# Altium footprint library PcbLib1.PcbLib: 56 footprints (part 1 of 4)
Each footprint in its own frame and in the unit in brackets; x right, y up, seen from the top. Pads: shape width x height; smd on the part's side, far side on the other; paste and mask are expansions set on the pad; w line width, h text height; cw(c..) or ccw(c..) is an arc to the next point about the centre after c.
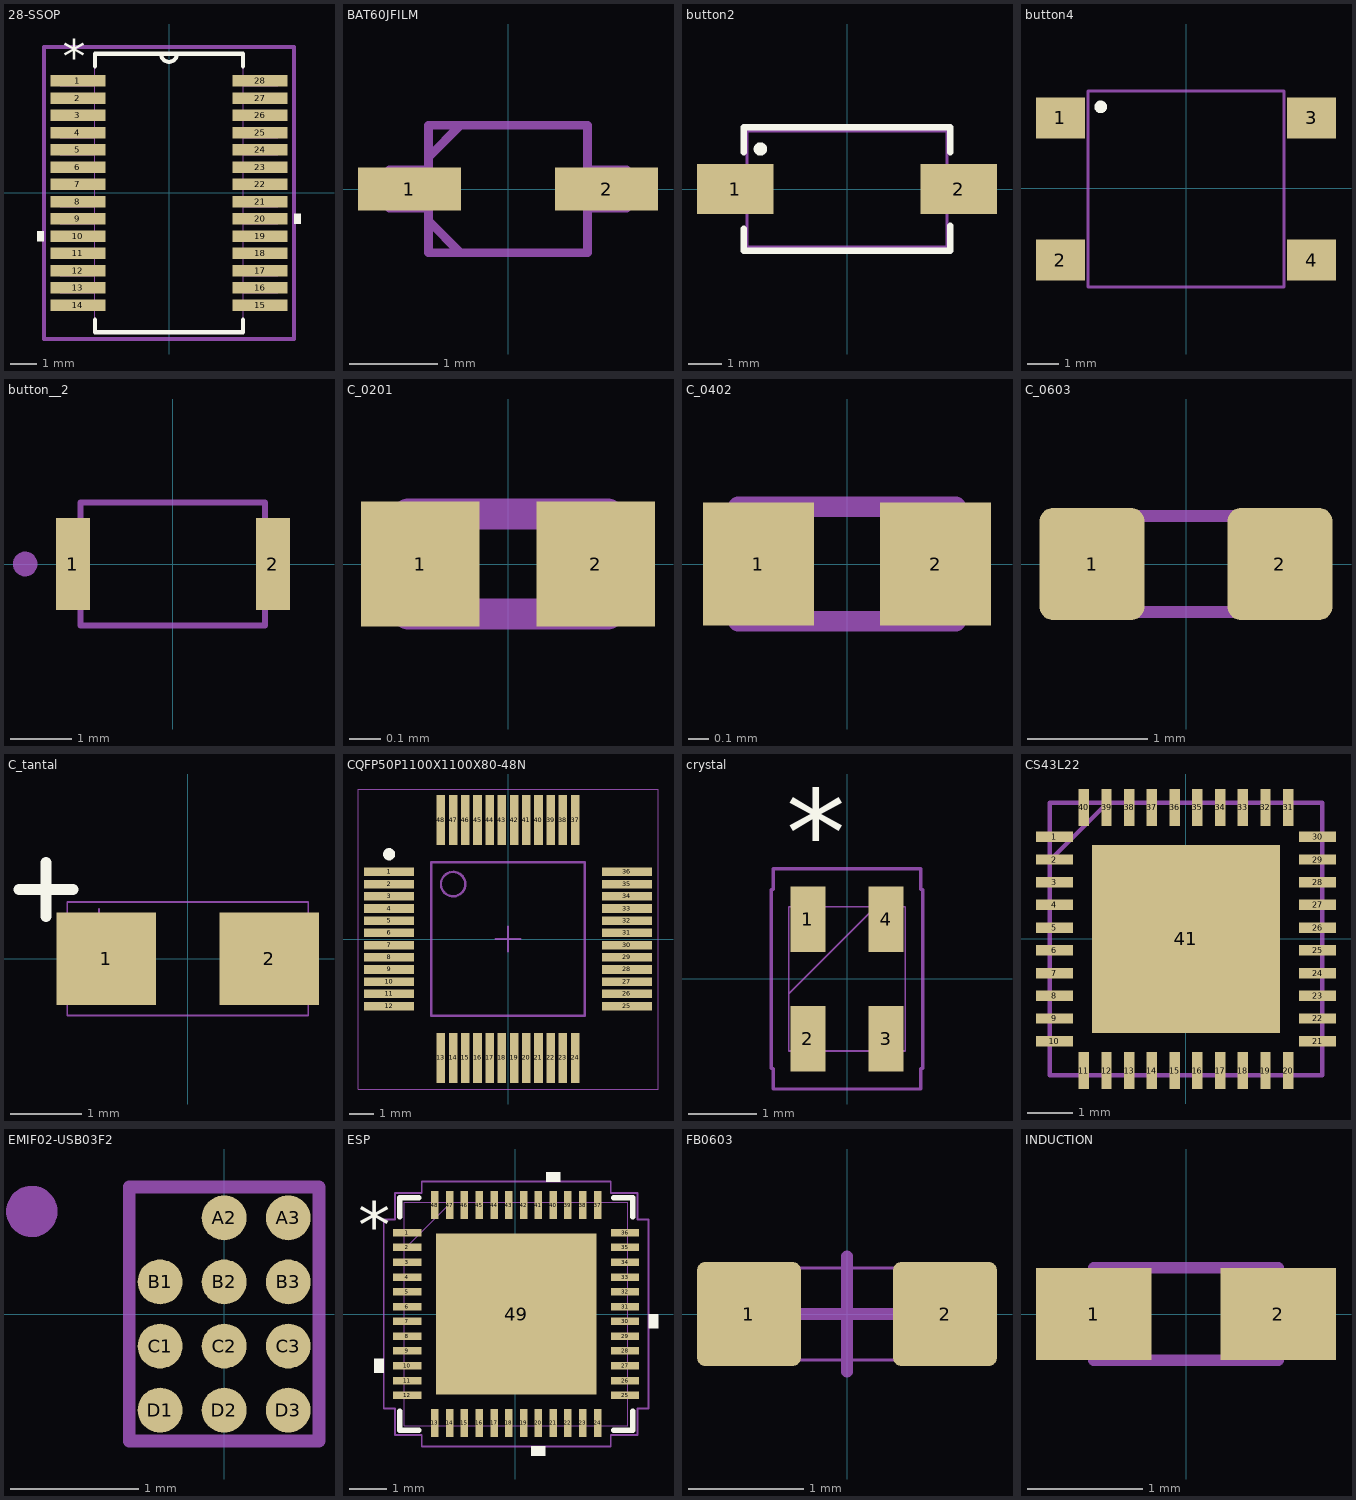
[diagram p0: the footprints below, top view; thin cyan lines are the x and y axes]

## 28-SSOP [mil]
pads (28):
  rect 81x17 smd paste-40.5 mask-40.5: 1(-135,166.34) 2(-135,140.75) 3(-135,115.16) 4(-135,89.57) 5(-135,63.98) 6(-135,38.39) 7(-135,12.8) 8(-135,-12.8) 9(-135,-38.39) 10(-135,-63.98) 11(-135,-89.57) 12(-135,-115.16) 13(-135,-140.75) 14(-135,-166.34) 15(135,-166.34) 16(135,-140.75) 17(135,-115.16) 18(135,-89.57) 19(135,-63.98) 20(135,-38.39) 21(135,-12.8) 22(135,12.8) 23(135,38.39) 24(135,63.98) 25(135,89.57) 26(135,115.16) 27(135,140.75) 28(135,166.34)
Top Overlay:
  region: 185.5,-30.89 195.5,-30.89 195.5,-45.89 185.5,-45.89
  region: -185.5,-56.48 -195.5,-56.48 -195.5,-71.48 -185.5,-71.48
  lines w6: -110,-187.94 -110,-206.5 110,-206.5 110,-187.94 ; -110,187.94 -110,206.5 110,206.5 110,187.94 ; -12,206.5 ccw(c0,206.5) 12,206.5
  text "*" at -157.5,178.34 h50
Top Assembly:
  lines w6: -185.5,-216.5 -185.5,216.5 185.5,216.5 185.5,-216.5 -185.5,-216.5
Mechanical 13:
  lines w0: -12,206.5 ccw(c0,206.5) 12,206.5
  lines w1: -161.5,-173.84 -110,-173.84 -110,-158.84 -161.5,-158.84 -161.5,-173.84 ; -161.5,-148.25 -110,-148.25 -110,-133.25 -161.5,-133.25 -161.5,-148.25 ; -161.5,-122.66 -110,-122.66 -110,-107.66 -161.5,-107.66 -161.5,-122.66 ; -161.5,-97.07 -110,-97.07 -110,-82.07 -161.5,-82.07 -161.5,-97.07 ; -161.5,-71.48 -110,-71.48 -110,-56.48 -161.5,-56.48 -161.5,-71.48 ; -161.5,-45.89 -110,-45.89 -110,-30.89 -161.5,-30.89 -161.5,-45.89 ; -161.5,-20.3 -110,-20.3 -110,-5.3 -161.5,-5.3 -161.5,-20.3 ; -161.5,5.3 -110,5.3 -110,20.3 -161.5,20.3 -161.5,5.3 ; -161.5,30.89 -110,30.89 -110,45.89 -161.5,45.89 -161.5,30.89 ; -161.5,56.48 -110,56.48 -110,71.48 -161.5,71.48 -161.5,56.48 ; -161.5,82.07 -110,82.07 -110,97.07 -161.5,97.07 -161.5,82.07 ; -161.5,107.66 -110,107.66 -110,122.66 -161.5,122.66 -161.5,107.66 ; -161.5,133.25 -110,133.25 -110,148.25 -161.5,148.25 -161.5,133.25 ; -161.5,158.84 -110,158.84 -110,173.84 -161.5,173.84 -161.5,158.84 ; -110,-206.5 -110,206.5 110,206.5 110,-206.5 -110,-206.5 ; 110,-173.84 161.5,-173.84 161.5,-158.84 110,-158.84 110,-173.84 ; 110,-148.25 161.5,-148.25 161.5,-133.25 110,-133.25 110,-148.25 ; 110,-122.66 161.5,-122.66 161.5,-107.66 110,-107.66 110,-122.66 ; 110,-97.07 161.5,-97.07 161.5,-82.07 110,-82.07 110,-97.07 ; 110,-71.48 161.5,-71.48 161.5,-56.48 110,-56.48 110,-71.48 ; 110,-45.89 161.5,-45.89 161.5,-30.89 110,-30.89 110,-45.89 ; 110,-20.3 161.5,-20.3 161.5,-5.3 110,-5.3 110,-20.3 ; 110,5.3 161.5,5.3 161.5,20.3 110,20.3 110,5.3 ; 110,30.89 161.5,30.89 161.5,45.89 110,45.89 110,30.89 ; 110,56.48 161.5,56.48 161.5,71.48 110,71.48 110,56.48 ; 110,82.07 161.5,82.07 161.5,97.07 110,97.07 110,82.07 ; 110,107.66 161.5,107.66 161.5,122.66 110,122.66 110,107.66 ; 110,133.25 161.5,133.25 161.5,148.25 110,148.25 110,133.25 ; 110,158.84 161.5,158.84 161.5,173.84 110,173.84 110,158.84
  text "*" at -157.5,178.34 h50
3D body "DB28.step": height 79.09, standoff 0, extent -161.49,-206.49 161.5,206.5

## BAT60JFILM [mil]
pads (2):
  rect 46x19 smd paste+0 mask+0: 1(-44,0) 2(44,0)
Top Assembly:
  lines w3.94: -35.5,-14.25 -21.25,-28.5 ; -35.5,14.25 -21.25,28.5 ; -53,-8.5 -53,8.5 -35.5,8.5 -35.5,-8.5 -53,-8.5 ; -35.5,-28.5 35.5,-28.5 35.5,28.5 -35.5,28.5 -35.5,-28.5 ; 35.5,-8.5 35.5,8.5 53,8.5 53,-8.5 35.5,-8.5
Mechanical 13:
  text "*" at -38,-25 h50
3D body "CR_60JFILM_STM.step": height 45.12, standoff 0, extent -52.99,-28.5 53,28.51

## button2 [mm]
pads (2):
  rect 2.3x1.5 smd: 1(-3.35,0) 2(3.35,0)
Top Overlay:
  circle w0.2: c-2.6,1.2 r0.1
  lines w0.2: -3.1,-1.2 -3.1,-1.85 3.1,-1.85 3.1,-1.1 ; -3.1,1.1 -3.1,1.85 3.1,1.85 3.1,1.1
Mechanical 13:
  lines w0.1: -3,-1.75 3,-1.75 3,1.75 -3,1.75 -3,-1.75
3D body "step_temp.STEP": height 4.3, standoff 0, extent -4,-1.75 4,1.75

## button4 [mm]
pads (4):
  rect 1.55x1.3 smd: 1(-3.975,2.225) 2(-3.975,-2.275) 3(3.975,2.225) 4(3.975,-2.275)
Top Overlay:
  circle w0.2: c-2.7,2.575 r0.1
Top Assembly:
  lines w0.1: -3.1,-3.125 -3.1,3.075 3.1,3.075 3.1,-3.125 -3.1,-3.125
3D body "step_temp.STEP": height 4.3, standoff 0, extent -4.5,-3.125 4.5,3.075

## button__2 [mm]
pads (2):
  rect 0.55x1.5 smd paste+0 mask+0.102: 1(-1.625,0) 2(1.625,0)
Top Assembly:
  lines w0.1: -1.5,-1 -1.5,1 1.5,1 1.5,-1 -1.5,-1
Mechanical 13:
  circle w0.2: c-2.4,0 r0.1
3D body "step_temp.STEP": height 0.7, standoff 0, extent -1.75,-1.1 1.75,1.1

## C_0201 [mm]
pads (2):
  rect 0.38x0.4 smd: 1(-0.281,0) 2(0.281,0)
Top Assembly:
  lines w0.1: -0.32,-0.16 -0.32,0.16 0.32,0.16 0.32,-0.16 -0.32,-0.16
3D body "step_temp.STEP": height 0.3, standoff -0.03, extent -0.3,-0.15 0.3,0.15

## C_0402 [mm]
pads (2):
  rect 0.54x0.6 smd: 1(-0.432,0) 2(0.432,0)
Top Assembly:
  lines w0.1: -0.53,-0.28 0.53,-0.28 0.53,0.28 -0.53,0.28 -0.53,-0.28
3D body "step_temp.STEP": height 0.52, standoff -0.03, extent -0.5,-0.25 0.5,0.25

## C_0603 [mm]
pads (2):
  rrect25% 0.87x0.93 smd: 1(-0.78,0) 2(0.78,0)
Top Assembly:
  lines w0.1: -0.8,-0.4 0.8,-0.4 0.8,0.4 -0.8,0.4 -0.8,-0.4
3D body "1uX7R.STEP": height 0.76, standoff -0.04, extent -0.8,-0.475 0.8,0.425

## C_tantal [mm]
pads (2):
  rect 1.405x1.3 smd paste+0 mask+0: 1(-1.15,0) 2(1.15,0)
Top Overlay:
  lines w0.152: -2.381,0.975 -1.619,0.975 ; -2,0.594 -2,1.356
Top Assembly:
  lines w0.025: -1.631,0.325 -0.869,0.325 ; -1.25,-0.056 -1.25,0.706 ; -1.7,-0.8 -1.7,0.8 1.7,0.8 1.7,-0.8 -1.7,-0.8
3D body "CAPMP34X16_18N_KEM.step": height 1.85, standoff 0, extent -1.7,-0.8 1.7,0.8

## CQFP50P1100X1100X80-48N [mm] "CQFP, 48-Leads, Body 11.00x11.00mm, Pitch 0.50mm, IPC Medium Density"
height 0.8
pads (48):
  rect 2.05x0.35 smd: 1(-4.875,2.75) 2(-4.875,2.25) 3(-4.875,1.75) 4(-4.875,1.25) 5(-4.875,0.75) 6(-4.875,0.25) 7(-4.875,-0.25) 8(-4.875,-0.75) 9(-4.875,-1.25) 10(-4.875,-1.75) 11(-4.875,-2.25) 12(-4.875,-2.75) 25(4.875,-2.75) 26(4.875,-2.25) 27(4.875,-1.75) 28(4.875,-1.25) 29(4.875,-0.75) 30(4.875,-0.25) 31(4.875,0.25) 32(4.875,0.75) 33(4.875,1.25) 34(4.875,1.75) 35(4.875,2.25) 36(4.875,2.75)
  rect 0.35x2.05 smd: 13(-2.75,-4.875) 14(-2.25,-4.875) 15(-1.75,-4.875) 16(-1.25,-4.875) 17(-0.75,-4.875) 18(-0.25,-4.875) 19(0.25,-4.875) 20(0.75,-4.875) 21(1.25,-4.875) 22(1.75,-4.875) 23(2.25,-4.875) 24(2.75,-4.875) 37(2.75,4.875) 38(2.25,4.875) 39(1.75,4.875) 40(1.25,4.875) 41(0.75,4.875) 42(0.25,4.875) 43(-0.25,4.875) 44(-0.75,4.875) 45(-1.25,4.875) 46(-1.75,4.875) 47(-2.25,4.875) 48(-2.75,4.875)
Top Overlay:
  circle w0.25: c-4.875,3.475 r0.125
Top Assembly:
  circle w0.1: c-2.25,2.25 r0.5
  lines w0.1: -3.15,-3.15 3.15,-3.15 3.15,3.15 -3.15,3.15 -3.15,-3.15
Mechanical 15:
  lines w0.05: -6.15,-6.15 -6.15,6.15 6.15,6.15 6.15,-6.15 -6.15,-6.15
  lines w0.1: -0.5,0 0.5,0 ; 0,-0.5 0,0.5
3D body "LQFP48_STM.step": height 1.6, standoff 0, extent -4.597,-4.597 4.597,4.597

## crystal [mil]
pads (4):
  rect 20.03x37.81 smd paste+0 mask+0: 1(-22.5,34.41) 2(-22.5,-34.41) 3(22.5,-34.41) 4(22.5,34.41)
Top Overlay:
  text "*" at -35,59.31 h50
Mechanical 13:
  lines w1: -33.5,-8.5 16.5,41.5 ; -33.5,-41.5 -11.5,-41.5 -33.5,-41.5 ; -33.5,-41.5 33.5,-41.5 ; -33.5,-41.5 -33.5,41.5 ; -33.5,41.5 -11.5,41.5 -33.5,41.5 ; -33.5,41.5 33.5,41.5 ; 33.5,-41.5 11.5,-41.5 33.5,-41.5 ; 33.5,-41.5 33.5,41.5 ; 33.5,41.5 11.5,41.5 33.5,41.5
  text "*" at -35,-9.5 h50
Mechanical 15:
  lines w1.97: -43.5,-51.5 -43.5,2.48 -43.5,-2.48 -43.5,51.5 -42.52,51.5 -42.52,63.31 42.52,63.31 42.52,51.5 43.5,51.5 43.5,-2.48 43.5,2.48 43.5,-51.5 42.52,-51.5 42.52,-63.31 -42.52,-63.31 -42.52,-51.5 -43.5,-51.5
3D body "NX2016SA-40M-STD-CZS-3_NDK.step": height 20.12, standoff 0, extent -33.5,-41.5 33.5,41.5

## CS43L22 [mil]
pads (41):
  rect 32x9 smd paste+0 mask+0: 1(-114,88.58) 2(-114,68.9) 3(-114,49.21) 4(-114,29.53) 5(-114,9.84) 6(-114,-9.84) 7(-114,-29.53) 8(-114,-49.21) 9(-114,-68.9) 10(-114,-88.58) 21(114,-88.58) 22(114,-68.9) 23(114,-49.21) 24(114,-29.53) 25(114,-9.84) 26(114,9.84) 27(114,29.53) 28(114,49.21) 29(114,68.9) 30(114,88.58)
  rect 9x32 smd paste+0 mask+0: 11(-88.58,-114) 12(-68.9,-114) 13(-49.21,-114) 14(-29.53,-114) 15(-9.84,-114) 16(9.84,-114) 17(29.53,-114) 18(49.21,-114) 19(68.9,-114) 20(88.58,-114) 31(88.58,114) 32(68.9,114) 33(49.21,114) 34(29.53,114) 35(9.84,114) 36(-9.84,114) 37(-29.53,114) 38(-49.21,114) 39(-68.9,114) 40(-88.58,114)
  rect 163x163 smd paste-81.5 mask+0: 41(0,0)
Top Paste:
  region: 77.56,-31.1 31.1,-31.1 31.1,-77.56 77.56,-77.56
  region: 77.56,23.23 31.1,23.23 31.1,-23.23 77.56,-23.23
  region: 77.56,77.56 31.1,77.56 31.1,31.1 77.56,31.1
  region: 23.23,-31.1 -23.23,-31.1 -23.23,-77.56 23.23,-77.56
  region: 23.23,23.23 -23.23,23.23 -23.23,-23.23 23.23,-23.23
  region: 23.23,77.56 -23.23,77.56 -23.23,31.1 23.23,31.1
  region: -31.1,-31.1 -77.56,-31.1 -77.56,-77.56 -31.1,-77.56
  region: -31.1,23.23 -77.56,23.23 -77.56,-23.23 -31.1,-23.23
  region: -31.1,77.56 -77.56,77.56 -77.56,31.1 -31.1,31.1
Top Assembly:
  lines w3.94: -118,68 -68,118 ; -118,-118 -118,118 118,118 118,-118 -118,-118 ; -118,-94.08 -118,-83.08 -118,-94.08 ; -118,-74.4 -118,-63.4 -118,-74.4 ; -118,-54.71 -118,-43.71 -118,-54.71 ; -118,-35.03 -118,-24.03 -118,-35.03 ; -118,-15.34 -118,-4.34 -118,-15.34 ; -118,4.34 -118,15.34 -118,4.34 ; -118,24.03 -118,35.03 -118,24.03 ; -118,43.71 -118,54.71 -118,43.71 ; -118,63.4 -118,74.4 -118,63.4 ; -118,83.08 -118,94.08 -118,83.08 ; -94.08,-118 -83.08,-118 -94.08,-118 ; -94.08,118 -83.08,118 -94.08,118 ; -74.4,-118 -63.4,-118 -74.4,-118 ; -74.4,118 -63.4,118 -74.4,118 ; -54.71,-118 -43.71,-118 -54.71,-118 ; -54.71,118 -43.71,118 -54.71,118 ; -35.03,-118 -24.03,-118 -35.03,-118 ; -35.03,118 -24.03,118 -35.03,118 ; -15.34,-118 -4.34,-118 -15.34,-118 ; -15.34,118 -4.34,118 -15.34,118 ; 4.34,-118 15.34,-118 4.34,-118 ; 4.34,118 15.34,118 4.34,118 ; 24.03,-118 35.03,-118 24.03,-118 ; 24.03,118 35.03,118 24.03,118 ; 43.71,-118 54.71,-118 43.71,-118 ; 43.71,118 54.71,118 43.71,118 ; 63.4,-118 74.4,-118 63.4,-118 ; 63.4,118 74.4,118 63.4,118 ; 83.08,-118 94.08,-118 83.08,-118 ; 83.08,118 94.08,118 83.08,118 ; 118,-94.08 118,-83.08 118,-94.08 ; 118,-74.4 118,-63.4 118,-74.4 ; 118,-54.71 118,-43.71 118,-54.71 ; 118,-35.03 118,-24.03 118,-35.03 ; 118,-15.34 118,-4.34 118,-15.34 ; 118,4.34 118,15.34 118,4.34 ; 118,24.03 118,35.03 118,24.03 ; 118,43.71 118,54.71 118,43.71 ; 118,63.4 118,74.4 118,63.4 ; 118,83.08 118,94.08 118,83.08
Mechanical 13:
  text "*" at -110.5,73.43 h50
3D body "CIR-QFN-40.step": height 39.09, standoff 0, extent -117.99,-117.99 118,118

## EMIF02-USB03F2 [mm]
pads (11):
  round 0.35 smd: A2(0,0.75) A3(0.5,0.75) B1(-0.5,0.25) B2(0,0.25) B3(0.5,0.25) C1(-0.5,-0.25) C2(0,-0.25) C3(0.5,-0.25) D1(-0.5,-0.75) D2(0,-0.75) D3(0.5,-0.75)
Top Assembly:
  lines w0.1: -0.74,-0.99 0.74,-0.99 0.74,0.99 -0.74,0.99 -0.74,-0.99
Mechanical 13:
  circle w0.2: c-1.5,0.8 r0.1
3D body "step_temp.STEP": height 0.65, standoff 0, extent -0.72,-0.97 0.72,0.97

## ESP [mil]
pads (49):
  rect 30x8 smd paste+0 mask+0: 1(-115.02,86.61) 2(-115.02,70.87) 3(-115.02,55.12) 4(-115.02,39.37) 5(-115.02,23.62) 6(-115.02,7.87) 7(-115.02,-7.87) 8(-115.02,-23.62) 9(-115.02,-39.37) 10(-115.02,-55.12) 11(-115.02,-70.87) 12(-115.02,-86.61) 25(116.98,-86.61) 26(116.98,-70.87) 27(116.98,-55.12) 28(116.98,-39.37) 29(116.98,-23.62) 30(116.98,-7.87) 31(116.98,7.87) 32(116.98,23.62) 33(116.98,39.37) 34(116.98,55.12) 35(116.98,70.87) 36(116.98,86.61)
  rect 8x30 smd paste+0 mask+0: 13(-85.63,-116) 14(-69.88,-116) 15(-54.13,-116) 16(-38.39,-116) 17(-22.64,-116) 18(-6.89,-116) 19(8.86,-116) 20(24.61,-116) 21(40.35,-116) 22(56.1,-116) 23(71.85,-116) 24(87.6,-116) 37(87.6,116) 38(71.85,116) 39(56.1,116) 40(40.35,116) 41(24.61,116) 42(8.86,116) 43(-6.89,116) 44(-22.64,116) 45(-38.39,116) 46(-54.13,116) 47(-69.88,116) 48(-85.63,116)
  rect 171x171 smd paste-85.5 mask+0: 49(0.98,0)
Top Overlay:
  region: -140.02,-47.62 -150.02,-47.62 -150.02,-62.62 -140.02,-62.62
  region: 32.11,-141 17.11,-141 17.11,-151 32.11,-151
  region: 141.98,-0.37 151.98,-0.37 151.98,-15.37 141.98,-15.37
  region: 47.85,141 32.85,141 32.85,151 47.85,151
  lines w6: -123.02,-103.71 -123.02,-124 -102.73,-124 ; -123.02,103.71 -123.02,124 -102.73,124 ; 104.7,-124 124.98,-124 124.98,-103.71 ; 104.7,124 124.98,124 124.98,103.71
  text "*" at -167.52,69.49 h50
Top Paste:
  region: -31.45,81.56 -80.58,81.56 -80.58,32.44 -31.45,32.44
  region: -31.45,24.56 -80.58,24.56 -80.58,-24.56 -31.45,-24.56
  region: -31.45,-32.44 -80.58,-32.44 -80.58,-81.56 -31.45,-81.56
  region: 25.55,81.56 -23.58,81.56 -23.58,32.44 25.55,32.44
  region: 25.55,24.56 -23.58,24.56 -23.58,-24.56 25.55,-24.56
  region: 25.55,-32.44 -23.58,-32.44 -23.58,-81.56 25.55,-81.56
  region: 82.55,81.56 33.42,81.56 33.42,32.44 82.55,32.44
  region: 82.55,24.56 33.42,24.56 33.42,-24.56 82.55,-24.56
  region: 82.55,-32.44 33.42,-32.44 33.42,-81.56 82.55,-81.56
Top Assembly:
  lines w1.97: -140.02,-100.61 -140.02,100.61 -128.02,100.61 -128.02,129 -99.63,129 -99.63,141 101.6,141 101.6,129 129.98,129 129.98,100.61 141.98,100.61 141.98,-100.61 129.98,-100.61 129.98,-129 101.6,-129 101.6,-141 -99.63,-141 -99.63,-129 -128.02,-129 -128.02,-100.61 -140.02,-100.61
Mechanical 13:
  lines w1: -118.02,69 -68.02,119 ; -118.02,-119 119.98,-119 119.98,119 -118.02,119 -118.02,-119 ; -118.02,-91.61 -118.02,-81.61 -118.02,-91.61 ; -118.02,-75.87 -118.02,-65.87 -118.02,-75.87 ; -118.02,-60.12 -118.02,-50.12 -118.02,-60.12 ; -118.02,-44.37 -118.02,-34.37 -118.02,-44.37 ; -118.02,-28.62 -118.02,-18.62 -118.02,-28.62 ; -118.02,-12.87 -118.02,-2.87 -118.02,-12.87 ; -118.02,2.87 -118.02,12.87 -118.02,2.87 ; -118.02,18.62 -118.02,28.62 -118.02,18.62 ; -118.02,34.37 -118.02,44.37 -118.02,34.37 ; -118.02,50.12 -118.02,60.12 -118.02,50.12 ; -118.02,65.87 -118.02,75.87 -118.02,65.87 ; -118.02,81.61 -118.02,91.61 -118.02,81.61 ; -90.63,-119 -80.63,-119 -90.63,-119 ; -90.63,119 -80.63,119 -90.63,119 ; -74.88,-119 -64.88,-119 -74.88,-119 ; -74.88,119 -64.88,119 -74.88,119 ; -59.13,-119 -49.13,-119 -59.13,-119 ; -59.13,119 -49.13,119 -59.13,119 ; -43.39,-119 -33.39,-119 -43.39,-119 ; -43.39,119 -33.39,119 -43.39,119 ; -27.64,-119 -17.64,-119 -27.64,-119 ; -27.64,119 -17.64,119 -27.64,119 ; -11.89,-119 -1.89,-119 -11.89,-119 ; -11.89,119 -1.89,119 -11.89,119 ; 3.86,-119 13.86,-119 3.86,-119 ; 3.86,119 13.86,119 3.86,119 ; 19.61,-119 29.61,-119 19.61,-119 ; 19.61,119 29.61,119 19.61,119 ; 35.35,-119 45.35,-119 35.35,-119 ; 35.35,119 45.35,119 35.35,119 ; 51.1,-119 61.1,-119 51.1,-119 ; 51.1,119 61.1,119 51.1,119 ; 66.85,-119 76.85,-119 66.85,-119 ; 66.85,119 76.85,119 66.85,119 ; 82.6,-119 92.6,-119 82.6,-119 ; 82.6,119 92.6,119 82.6,119 ; 119.98,-91.61 119.98,-81.61 119.98,-91.61 ; 119.98,-75.87 119.98,-65.87 119.98,-75.87 ; 119.98,-60.12 119.98,-50.12 119.98,-60.12 ; 119.98,-44.37 119.98,-34.37 119.98,-44.37 ; 119.98,-28.62 119.98,-18.62 119.98,-28.62 ; 119.98,-12.87 119.98,-2.87 119.98,-12.87 ; 119.98,2.87 119.98,12.87 119.98,2.87 ; 119.98,18.62 119.98,28.62 119.98,18.62 ; 119.98,34.37 119.98,44.37 119.98,34.37 ; 119.98,50.12 119.98,60.12 119.98,50.12 ; 119.98,65.87 119.98,75.87 119.98,65.87 ; 119.98,81.61 119.98,91.61 119.98,81.61
  text "*" at -112.52,69.49 h50
3D body "QFN48_SLP_6X6_EXP.step": height 35.12, standoff 0, extent -118.03,-119.01 120,119.02

## FB0603 [mm]
pads (2):
  rrect15% 0.9x0.9 smd mask+0.05: 1(-0.85,0) 2(0.85,0)
Top Assembly:
  region: 0.5,-0.4 0.8,-0.4 0.8,0.4 0.5,0.4
  region: -0.8,-0.4 -0.5,-0.4 -0.5,0.4 -0.8,0.4
  lines w0.025: -0.8,-0.4 0.8,-0.4 0.8,0.4 -0.8,0.4 -0.8,-0.4
Top Courtyard:
  lines w0.1: -0.5,0 0.5,0 ; 0,-0.5 0,0.5
3D body "FB1608.STEP": height 0.8, standoff 0, extent -0.8,-0.4 0.8,0.4

## INDUCTION [mm]
pads (2):
  rect 1x0.8 smd: 1(-0.8,0) 2(0.8,0)
Top Assembly:
  lines w0.1: -0.8,-0.4 -0.8,0.4 0.8,0.4 0.8,-0.4 -0.8,-0.4
3D body "step_temp.STEP": height 0.95, standoff 0, extent -0.8,-0.4 0.8,0.4